# Altium integrated library Integrated_Library - 02.02.25 - 22.49.IntLib: 792 symbols (part 2 of 11) (continued)
## CMP-002-00006-2
designator SD?, comment ST9S008V4AR1500
Micro SD Memory Card Connector, 8 Position, 0.5 A, 10 V, -25 to 85 degC, 8-Pin SMD, RoHS, Tape and Reel; Manufacturer: JAE Electronics; Current Rating: 500mA; Gender: Male; Voltage Rating: 10V; Connector Type: SDCard; Mating Cycles: 10000; Package Version: Rev. 2, 12/2007; Package URL: https://datasheet.ciiva.com/683/sj108062-683405.pdf; Package Reference: ST9S008V4AR1500; Min Operating Temperature: -25°C; Manufacturer URL: http://www.jaeusa.com/; Lead Pitch: 1.1mm; Datasheet URL: http://jae-connector.com/en/pdf/MB-0177-1E_ST9.pdf; RoHS Compliant: True; Pins: 8; Package Quantity: 1500; Mounting Technology: SM; Contact Finish: Gold; Packaging: TapeandReel; Case/Package: ST9S008V4AR1500; Contact Plating: Gold; Package Description: 8-Pin Surface Mount Device, Body 15.2 x 13.7 mm, Pitch 1.1 mm; Max Operating Temperature: 85°C; Datasheet Version: Dec-08; Contact Material: Copper
footprint JAE-ST9S008V4AR1500_V (SD Card, 8-Leads, Body 15.2x13.7mm, Pitch 1.1mm)
pins: 1, 2, 3, 4, 5, 6, 7, 8, MP1, MP2, MP3, MP4, MP5, MP6

## CMP-002-00007-2
designator J?, comment 35RASMT4BHNTRX
Female 3.5 mm Phone Jack, 5 Position, Height 5 mm, RoHS, Tape and Reel; Manufacturer: Switchcraft; Shielding: Unshielded; Connector Type: Audio; Max Current Rating: 3A; Voltage Rating: 250V; Datasheet Version: Rev. C, 07/2014; Case/Package: 35RASMT4BHNTRX; Gender: Female; Package Description: Female 3.5 mm Phone Jack, 5 Position, Height 5 mm; Max Operating Temperature: 85°C; Colour: Black; Manufacturer URL: http://www.switchcraft.com/; Package Reference: 35RASMT4BHNTRX; Packaging: TapeandReel; Pins: 3; Mounting Technology: SM; Min Operating Temperature: -25°C; Contact Material: Copper; Datasheet URL: http://www.switchcraft.com/Drawings/35rasmt4bhntrx_cd.pdf; Contact Plating: Silver; Current Rating: 3A; RoHS Compliant: True; Package Quantity: 800
footprint SWIT-35RASMT4BHNTRX_V (Jack, 5-Leads, Body 17x6mm)
pins: 1, 2, 3, 4, 5

## CMP-002-00008-2
designator J?, comment PJRAN1X1U01X
Female Phono Jack, 3 Position, Height 13 mm, Tail Length 4 mm, RoHS, Bulk; Manufacturer: Switchcraft; Voltage Rating: 34V; Shielding: Unshielded; Current Rating: 2A; Connector Type: Audio; Min Operating Temperature: -25°C; Contact Plating: Silver; Manufacturer URL: http://www.switchcraft.com/; Pins: 1; RoHS Compliant: True; Package Reference: PJRAN1X1U01X; Datasheet Version: Rev. A, 01/2006; Package Description: Female Phono Jack, 3 Position, Height 13 mm, Tail Length 4 mm; Gender: Female; Max Operating Temperature: 85°C; Case/Package: Metal; Datasheet URL: http://www.conxall.com/Drawings/pjran1x1u__x_series_cd.pdf; Contact Material: Copper; Colour: Black; Max Current Rating: 2A; Mounting Technology: TH; Max Voltage Rating (DC): 34V; Package Quantity: 1
footprint SWIT-PJRAN1X1U01X_V (Jack, 3-Leads, Body 19.5x10mm)
pins: 1 SLEEVE, 2 TIP, 3 SHUNT

## CMP-002-00009-2
designator J?, comment RCJ-041
Female RCJ Jack, 2 Position, Height 11.724 mm, Tail Length 4 mm, RoHS, Bulk; Manufacturer: CUI Inc; Connector Type: Audio; Shielding: Unshielded; Housing Material: Plastic; Case/Package: RCJ-041; Min Operating Temperature: -20°C; Contact Material: Brass; Package Reference: RCJ-041; Packaging: Bulk; Package Quantity: 400; Datasheet Version: Rev. B, 02/2012; Manufacturer URL: http://www.cui.com/; Package Description: Female RCJ Jack, 2 Position, Height 11.724 mm, Tail Length 4 mm; RoHS Compliant: True; Datasheet URL: http://www.cui.com/product/resource/rcj-04x.pdf; Max Operating Temperature: 85°C; Gender: Female; Mounting Technology: TH
footprint CUI-RCJ-041_V (Jack, 2-Leads, Body 19.5x10mm)
pins: 1, 2

## CMP-002-00010-2
designator J?, comment SJ-3506-SMT-TR
Female Mid Mount Audio Jack, 6 Position, Height 2.55 mm, Tail Length 2 mm, -25 to 85 degC, RoHS, Tape and Reel; Manufacturer: CUI Inc; Current Rating: 1A; Shielding: Shielded; Max Operating Temperature: 85°C; Connector Type: Audio; Housing Material: Plastic; Datasheet Version: Rev. 1.01, 11/2012; Package Description: Female Mid Mount Audio Jack, 6 Position, Height 2.55 mm, Tail Length 2 mm; Datasheet URL: http://www.cui.com/product/resource/sj-3506-smt.pdf; Gender: Female; Mounting Technology: TH; Min Operating Temperature: -25°C; Contact Material: Brass; Package Reference: SJ-3506-SMT-TR; Case/Package: SJ-3506-SMT-TR; Manufacturer URL: http://www.cui.com/; Package Quantity: 500; Packaging: TapeandReel; RoHS Compliant: True
footprint CUI-SJ-3506-SMT-TR_V (Jack, 6-Leads, Body 15.4x12.8mm)
pins: 1 S "Sleeve", 2 T "Tip", 3 R "Ring", 4 IR "Isolated ring", 5 RN "Isolated ring switch (N-O)", 6 TN "Tip switch", 7 SHLD1 "Shield", 8 SHLD2 "Shield"

## CMP-002-00011-2
designator J?, comment 10029449-001RLF
Type A HDMI Receptacle without Flange, Pitch 0.5 mm, 19 Positions, -55 to 85 degC, RoHS, Tape and Reel; Manufacturer: FCI Electronics; Voltage Rating: 40V; Current Rating: 500mA; Gender: Female; Connector Type: Display; RoHS Compliant: True; Lead Pitch: 0.5mm; Case/Package: Metal; Datasheet Version: Rev. S, 06/2012; Datasheet URL: https://datasheet.ciiva.com/851/10029449-851120.pdf; Contact Material: Copper; Pins: 19; Packaging: TapeandReel; Package Reference: 10029449-001RLF; Colour: Black; Contact Plating: Gold; Package Description: 19-Pin Surface Mount Device, Body 15 x 9 mm, Pitch 0.5 mm; Mounting Technology: SM; Package Quantity: 400; Min Operating Temperature: -55°C; Manufacturer URL: http://portal.fciconnect.com/; Max Operating Temperature: 85°C
footprint FCI-10029449-001RLF_V (SMD, 19-Leads, Body 15x9mm, Pitch 0.5mm)
pins: 1 TMDS DATA2+, 2 TMDS DATA2 SHIELD, 3 TMDS DATA2-, 4 TMDS DATA1+, 5 TMDS DATA1 SHIELD, 6 TMDS DATA1-, 7 TMDS DATA0+, 8 TMDS DATA0 SHIELD, 9 TMDS DATA0-, 10 TMDS CLOCK+, 11 TMDS CLOCK SHIELD, 12 TMDS CLOCK-, 13 CEC, 14 N.C., 15 SCL, 16 SDA, 17 DDC/CEC GROUND, 18 +5V POWER, 19 HOT PLUG DETECT, 20 SHLD1, 21 SHLD2, 22 SHLD3, 23 SHLD4
text: HDMI

## CMP-002-00012-2
designator J?, comment 1747981-1
HDMI Receptacle, Pitch 0.5 mm, 19 Position, Height 6.38 mm, RoHS, Tape and Reel; Manufacturer: TE Connectivity; Gender: Female; Connector Type: Display; Voltage Rating: 40V; Package Reference: 1747981-1; Packaging: TapeandReel; Colour: Silver; Datasheet Version: Rev. F5, 12/2015; Case/Package: Metal; Contact Plating: Gold; Package Description: HDMI Receptacle, Pitch 0.5 mm, 19 Position, Height 6.38 mm; RoHS Compliant: True; Manufacturer URL: http://www.te.com/; Contact Material: Copper; Package Quantity: 300; Pins: 19; Lead Pitch: 0.5mm; Datasheet URL: http://www.te.com/commerce/DocumentDelivery/DDEController?Action=showdoc&DocId=Customer+Drawing%7F1747981%7FF5%7Fpdf%7FEnglish%7FENG_CD_1747981_F5.pdf%7F1747981-1; Mounting Technology: SM
footprint TE-1747981-1_V (Connector, 19-Leads, Body 11.55x15mm, Pitch 0.5mm)
pins: 1 TMDS DATA2+, 2 TMDS DATA2 SHIELD, 3 TMDS DATA2-, 4 TMDS DATA1+, 5 TMDS DATA1 SHIELD, 6 TMDS DATA1-, 7 TMDS DATA0+, 8 TMDS DATA0 SHIELD, 9 TMDS DATA0-, 10 TMDS CLOCK+, 11 TMDS CLOCK SHIELD, 12 TMDS CLOCK-, 13 CEC, 14 N.C., 15 SCL, 16 SDA, 17 DDC/CEC GROUND, 18 +5V POWER, 19 HOT PLUG DETECT, 20 SHLD1, 21 SHLD2, 22 SHLD3, 23 SHLD4
text: HDMI

## CMP-002-00013-2
designator J?, comment RASM722X
Power Jack, 5 A, 250 V, 3-Pin SMD, RoHS, Bulk; Manufacturer: Switchcraft; Connector Type: DCJack; Package Reference: RASM722X; Mounting Technology: SM; Manufacturer URL: http://www.switchcraft.com/; Datasheet URL: http://www.switchcraft.com/Drawings/rasm732x_cd.pdf; RoHS Compliant: Unknown; Datasheet Version: Rev. A, 09/2005; Package Description: 3-Pin Surface Mount Device, Body 14.5 x 9 mm; Case/Package: RASM722X
footprint SWIT-RASM722X_V (SMD, 3-Leads, Body 14.5x9mm)
pins: 1 SLEEVE, 2 TIP, 3 SHUNT

## CMP-002-00014-2
designator P?, comment 1803277
Male Header, Pitch 3.81 mm, 1 x 2 Position, Height 7.25 mm, Tail Length 3.4 mm, RoHS, Bulk; Manufacturer: Phoenix Contact; Voltage Rating: 160V; Current Rating: 8A; Rows: 1; Mounting Technology: TH; Contact Plating: Tin; Case/Package: 1803277; Gender: Male; Diameter: 7.25mm; Datasheet Version: Feb-14; Colour: Green; Pins: 2; Lead Pitch: 0.15inch; Connector Type: Header; Package Quantity: 50; Max Current Rating: 8A; Manufacturer URL: http://www.phoenixcontact.com/; Packaging: Bulk; RoHS Compliant: True; Datasheet URL: https://datasheet.ciiva.com/16096/1803277-16096845.pdf; Package Reference: 1803277; Package Description: Male Header, Pitch 3.81 mm, 1 x 2 Position, Height 7.25 mm, Tail Length 3.4 mm
footprint PHOE-1803277_V (CONN, Body 9.2x9.01mm, Pitch 3.81mm)
pins: 1, 2

## CMP-002-00015-2
designator P?, comment 2340-6111TG
Male Header, Pitch 2.54 mm, 1 x 40 Position, Height 8.636 mm, Tail Length 3.05 mm, -55 to 105 degC, RoHS, Bulk; Manufacturer: 3M; Max Current Rating: 3A; Rows: 1; Max Operating Temperature: 105°C; RoHS Compliant: True; Manufacturer URL: http://www.3m.com/; Package Reference: 2340-6111TG; Package Quantity: 200; Min Operating Temperature: -55°C; Package Description: Male Header, Pitch 2.54 mm, 1 x 40 Position, Height 8.636 mm, Tail Length 3.05 mm; Gender: Male; Datasheet URL: https://datasheet.ciiva.com/5161/ts0766-242217-5161112.pdf; Packaging: Bulk; Lead Pitch: 0.1inch; Mounting Technology: TH; Case/Package: 2340-6111TG; Connector Type: Header; Datasheet Version: Aug-08; Pins: 40; Current Rating: 3A; Contact Finish: Gold; Contact Plating: Gold; Colour: Black; Contact Material: Copper
footprint 3M-2340-6111TG_V (THD, 40-Leads, Body 101.6x2.54mm, Pitch 2.54mm)
pins: 1, 2, 3, 4, 5, 6, 7, 8, 9, 10, 11, 12, 13, 14, 15, 16, 17, 18, 19, 20, 21, 22, 23, 24, 25, 26, 27, 28, 29, 30, 31, 32, 33, 34, 35, 36, 37, 38, 39, 40

## CMP-002-00016-2
designator P?, comment 4-103741-0
Male Header, Pitch 2.54 mm, 1 x 40 Position, Height 8.128 mm, Tail Length 2.286 mm, RoHS, Bulk; Manufacturer: TE Connectivity; Max Contact Resistance: 20mohm; Rows: 1; Current Rating: 3A; Max Current Rating: 1A; Contact Finish: Lead; Colour: Black; Package Reference: 4-103741-0; Contact Gender: Male; Packaging: Bulk; Contact Material: Bronze; Datasheet URL: http://sigma.octopart.com/12533693/technical_drawing/Agastat-4-103741-0.pdf; Package Description: Male Header, Pitch 2.54 mm, 1 x 40 Position, Height 8.128 mm, Tail Length 2.286 mm; Mounting Technology: TH; RoHS Compliant: True; Pins: 40; Gender: Male; Package Quantity: 100; Max Operating Temperature: 105°C; Min Operating Temperature: -65°C; Manufacturer URL: http://www.te.com/; Case/Package: 4-103741-0; Lead Pitch: 0.1inch; Contact Plating: Tin; Datasheet Version: Mar-11; Connector Type: Header
footprint TECO-4-103741-0_V (THD, 40-Leads, Body 101.194x2.337mm, Pitch 2.54mm)
pins: 1, 2, 3, 4, 5, 6, 7, 8, 9, 10, 11, 12, 13, 14, 15, 16, 17, 18, 19, 20, 21, 22, 23, 24, 25, 26, 27, 28, 29, 30, 31, 32, 33, 34, 35, 36, 37, 38, 39, 40

## CMP-002-00017-2
designator P?, comment 4-103777-0
Male Header, Pitch 2.54 mm, 2 x 40 Position, Height 8.13 mm, Tail Length 2.29 mm, -65 to 105 degC, RoHS, Bulk; Manufacturer: TE Connectivity; Rows: 2; Current Rating: 3A; Contact Material: Bronze; Contact Plating: Tin; Case/Package: 4-103777-0; Colour: Black; Packaging: Bulk; Datasheet URL: http://www.onlinecomponents.com/datasheet/41037770.aspx?p=10364676; Package Description: Male Header, Pitch 2.54 mm, 2 x 40 Position, Height 8.13 mm, Tail Length 2.29 mm; Datasheet Version: Rev. 6-04, 03/2006; Max Operating Temperature: 105°C; Contact Finish: Lead; RoHS Compliant: True; Package URL: http://www.mouser.com/ds/2/418/NG_CD_103777_F2-615203.pdf; Connector Type: Header; Lead Pitch: 2.54mm; Min Operating Temperature: -65°C; Gender: Male; Mounting Technology: TH; Pins: 80; Manufacturer URL: http://www.te.com/; Contact Gender: Male; Package Quantity: 50; Package Reference: 4-103777-0
footprint TECO-4-103777-0_V (THD, 80-Leads, Body 101.19x4.88mm, Pitch 2.54mm)
pins: 1, 2, 3, 4, 5, 6, 7, 8, 9, 10, 11, 12, 13, 14, 15, 16, 17, 18, 19, 20, 21, 22, 23, 24, 25, 26, 27, 28, 29, 30, 31, 32, 33, 34, 35, 36, 37, 38, 39, 40, 41, 42, 43, 44, 45, 46, 47, 48, 49, 50, 51, 52, 53, 54, 55, 56, 57, 58, 59, 60, 61, 62, 63, 64, 65, 66, 67, 68, 69, 70, 71, 72, 73, 74, 75, 76, 77, 78, 79, 80

## CMP-002-00018-2
designator P?, comment 5-146130-2
Male Header, Pitch 2.54 mm, 2 x 3 Position, Height 8.13 mm, -65 to 125 degC, RoHS, Tube; Manufacturer: TE Connectivity; Max Operating Temperature: 125°C; Datasheet Version: Oct-15; Package Description: Male Header, Pitch 2.54 mm, 2 x 3 Position, Height 8.13 mm; Case/Package: 5-146130-2; Datasheet URL: http://www.te.com/commerce/DocumentDelivery/DDEController?Action=showdoc&DocId=Customer+Drawing%7F146130%7FM%7Fpdf%7FEnglish%7FENG_CD_146130_M.pdf%7F5-146130-2; Manufacturer URL: http://www.te.com/; Connector Type: Header; Gender: Male; Mounting Technology: SM; Min Operating Temperature: -65°C; RoHS Compliant: Unknown; Package Reference: 5-146130-2
footprint TECO-5-146130-2_V (Header, 6-Leads, Body 7.21x4.88mm, Pitch 2.54mm)
pins: 1, 2, 3, 4, 5, 6

## CMP-002-00019-2
designator J?, comment 5-534237-8
Female Receptacle, Pitch 2.54 mm, 1 x 10 Position, Height 8.64 mm, Tail Length 2.92 mm, -65 to 105 degC, RoHS, Tube; Manufacturer: TE Connectivity; Max Contact Resistance: 12mohm; Connector Type: Header; Current Rating: 2A; Voltage Rating: 750V; Rows: 1; Datasheet Version: Apr-13; Contact Plating: Gold; Min Operating Temperature: -65°C; Manufacturer URL: http://www.te.com/; Mounting Technology: TH; Contact Material: Bronze; RoHS Compliant: True; Packaging: Rail/Tube; Contact Finish: Gold; Pins: 10; Case/Package: 5-534237-8; Max Operating Temperature: 105°C; Lead Pitch: 2.54mm; Gender: Female; Package Quantity: 22; Colour: Black; Package Description: Female Receptacle, Pitch 2.54 mm, 1 x 10 Position, Height 8.64 mm, Tail Length 2.92 mm; Package Reference: 5-534237-8; Datasheet URL: http://www.te.com/commerce/DocumentDelivery/DDEController?Action=showdoc&DocId=Customer+Drawing%7F534237%7FR5%7Fpdf%7FEnglish%7FENG_CD_534237_R5.pdf%7F5-534237-8
footprint TECO-5-534237-8_V (Receptacle, 10-Leads, Body 25.4x3.56mm, Pitch 2.54mm)
pins: 1, 2, 3, 4, 5, 6, 7, 8, 9, 10

## CMP-002-00020-2
designator P?, comment 68021-210HLF
Male Header, Pitch 2.54 mm, 2 x 5 Position, Height 4.83 mm, Tail Length 3.05 mm, Bulk; Manufacturer: FCI Electronics; Datasheet URL: http://portal.fciconnect.com/Comergent//fci/drawing/68020.pdf; Case/Package: 68021-210HLF-10; Manufacturer URL: http://portal.fciconnect.com/; Connector Type: Header; Mounting Technology: TH; Datasheet Version: Rev. BM, 04/2015; Package Description: Male Header, Pitch 2.54 mm, 2 x 5 Position, Height 4.83 mm, Tail Length 3.05 mm; Gender: Male; RoHS Compliant: Unknown; Package Reference: 68021-210HLF-10
footprint FCI-68021-210HLF-10_V (THD, 10-Leads, Body 12.7x2.54mm, Pitch 2.54mm)
pins: 1, 2, 3, 4, 5, 6, 7, 8, 9, 10

## CMP-002-00021-2
designator P?, comment 77311-462K05LF
Male Header, Pitch 2.54 mm, 1 x 5 Position, Height 16.24 mm, Tail Length 3.05 mm, -65 to 125 degC, RoHS, Tape and Reel; Manufacturer: FCI Electronics; Connector Type: Header; Manufacturer URL: http://portal.fciconnect.com/; Datasheet URL: http://portal.fciconnect.com/Comergent//fci/drawing/77311.pdf; Gender: Male; Case/Package: 77311-5; Package Reference: 77311-5; Datasheet Version: Rev. CK, 07/2016; Package Description: Male Header, Pitch 2.54 mm, 1 x 5 Position, Height 16.24 mm, Tail Length 3.05 mm; RoHS Compliant: Unknown; Mounting Technology: TH
footprint FCI-77311-5_V (THD, 5-Leads, Body 12.7x2.4mm, Pitch 2.54mm)
pins: 1 DTR, 2 RXI, 3 TXO, 4 VCC, 5 CTS

## CMP-002-00022-2
designator P?, comment 9-146281-0
Male Header, Pitch 2.54 mm, 1 x 40 Position, Height 8.21 mm, Tail Length 3.05 mm, -65 to 105 degC, RoHS, Bulk; Manufacturer: TE Connectivity; Current Rating: 3A; Rows: 1; Datasheet URL: http://www.te.com/commerce/DocumentDelivery/DDEController?Action=showdoc&DocId=Customer+Drawing%7F146281%7FG%7Fpdf%7FEnglish%7FENG_CD_146281_G_146281_1_c.dwg.pdf%7F9-146281-0; Contact Plating: Gold; Packaging: Tray; Lead Pitch: 2.54mm; Max Operating Temperature: 105°C; Manufacturer URL: http://www.te.com/; Connector Type: Header; Package Reference: 9-146281-0; Gender: Male; Package Description: Male Header, Pitch 2.54 mm, 1 x 40 Position, Height 8.21 mm, Tail Length 3.05 mm; Package Quantity: 100; Datasheet Version: Rev. G, 07/2014; Contact Gender: Male; Colour: Black; RoHS Compliant: True; Min Operating Temperature: -65°C; Mounting Technology: TH; Contact Material: Bronze; Package URL: http://www.te.com/commerce/DocumentDelivery/DDEController?Action=showdoc&DocId=Catalog+Section%7F1307819_SECTION_5%7F0908%7Fpdf%7FEnglish%7FENG_CS_1307819_SECTION_5_0908.pdf%7F9-146281-0; Case/Package: 9-146281-0; Contact Finish: Gold; Pins: 40
footprint TECO-9-146281-0_V (Header, 40-Leads, Body 101.2x2.34mm, Pitch 2.54mm)
pins: 1, 2, 3, 4, 5, 6, 7, 8, 9, 10, 11, 12, 13, 14, 15, 16, 17, 18, 19, 20, 21, 22, 23, 24, 25, 26, 27, 28, 29, 30, 31, 32, 33, 34, 35, 36, 37, 38, 39, 40

## CMP-002-00023-2
designator J?, comment 929850-01-10-RA
Female Header, Pitch 2.54 mm, 1 x 10 Position, Height 8.26 mm, Tail Length 3.18 mm, -40 to 105 degC, RoHS, Bulk; Manufacturer: 3M; Current Rating: 1A; Datasheet Version: Jun-13; Contact Finish: Gold; Package Description: Female Header, Pitch 2.54 mm, 1 x 10 Position, Height 8.26 mm, Tail Length 3.18 mm; Mounting Technology: TH; Max Operating Temperature: 105°C; Pins: 10; Lead Pitch: 2.54mm; RoHS Compliant: True; Contact Plating: Gold; Min Operating Temperature: -40°C; Colour: Black; Contact Gender: Female; Package Reference: 929850-01-10-RA; Gender: Female; Case/Package: 929850-01-10-RA; Packaging: Bulk; Package Quantity: 300; Datasheet URL: http://multimedia.3m.com/mws/media/22500O/3mtm-boardmount-skt-100-100x-100strt-sldr-tails-ts0815.pdf; Connector Type: Header; Contact Material: Copper; Manufacturer URL: http://www.3m.com/
footprint 3M-929850-01-10-RA_V (THD, 10-Leads, Body 25.4x2.54mm, Pitch 2.54mm)
pins: 1, 2, 3, 4, 5, 6, 7, 8, 9, 10

## CMP-002-00024-2
designator P?, comment 95278-101A06LF
Male Header, Pitch 2.54 mm, 2 x 3 Position, Height 14.4 mm, RoHS, Tape and Reel; Manufacturer: Amphenol; Package Reference: 95278-101A06LF; Package Description: Male Header, Pitch 2.54 mm, 2 x 3 Position, Height 14.4 mm; RoHS Compliant: Unknown; Case/Package: 95278-101A06LF; Connector Type: Header; Mounting Technology: SM; Gender: Male; Datasheet URL: http://portal.fciconnect.com/Comergent//fci/drawing/95278.pdf; Datasheet Version: Rev. AC, 03/2016
footprint AMPM-95278-101A06LF_V (SMD, 6-Leads, Body 7.26x4.83mm, Pitch 2.54mm)
pins: 1, 2, 3, 4, 5, 6

## CMP-002-00025-2
designator P?, comment B2P-VH(LF)(SN)
Male Header, Pitch 3.96 mm, 1 x 2 Position, Height 10.9 mm, Tail Length 3.7 mm, -25 to 85 degC, RoHS, Bulk; Manufacturer: JST; Case/Package: B2P-VH(LF)(SN); Connector Type: Header; Mounting Technology: TH; Package Reference: B2P-VH(LF)(SN); Package Description: Male Header, Pitch 3.96 mm, 1 x 2 Position, Height 10.9 mm, Tail Length 3.7 mm; Max Operating Temperature: 85°C; Manufacturer URL: http://www.jst.com/home2.html; RoHS Compliant: Unknown; Datasheet Version: May-16; Gender: Male; Min Operating Temperature: -25°C; Datasheet URL: http://www.jst-mfg.com/product/pdf/eng/eVH.pdf
footprint JST-B2P-VH(LF)(SN)_V (THD, 2-Leads, Body 8.5x7.86mm, Pitch 3.96mm)
pins: 1, 2

## CMP-002-00026-2
designator P?, comment B3P-VH(LF)(SN)
Male Header, Pitch 3.96 mm, 1 x 3 Position, Height 10.9 mm, Tail Length 3.7 mm, -25 to 85 degC, RoHS, Bulk; Manufacturer: JST; Case/Package: B3P-VH(LF)(SN); Connector Type: Header; Datasheet Version: May-16; Mounting Technology: TH; Package Description: Male Header, Pitch 3.96 mm, 1 x 3 Position, Height 10.9 mm, Tail Length 3.7 mm; Gender: Male; Manufacturer URL: http://www.jst.com/home2.html; Package Reference: B3P-VH(LF)(SN); Datasheet URL: http://www.jst-mfg.com/product/pdf/eng/eVH.pdf; Min Operating Temperature: -25°C; Max Operating Temperature: 85°C; RoHS Compliant: Unknown
footprint JST-B3P-VH(LF)(SN)-3_V (Connector, 3-Leads, Body 8.5x11.82mm, Pitch 3.96mm)
pins: 1, 2, 3

## CMP-002-00027-2
designator P?, comment PEC36SFCN
Male Header, Pitch 2.54 mm, 1 x 36 Position, Height 10.62 mm, Tail Length 8.13 mm, -65 to 125 degC, RoHS, Bulk; Manufacturer: Sullins; Contact Finish: Tin; Datasheet Version: Apr-13; Pins: 36; Datasheet URL: http://disti-assets.s3.amazonaws.com/testco-inc/files/datasheets/17515.pdf; RoHS Compliant: True; Case/Package: PEC36SFCN; Package Reference: PEC36SFCN; Colour: Black; Gender: Male; Connector Type: Header; Package Quantity: 1; Packaging: Bulk; Mounting Technology: TH; Package Description: Male Header, Pitch 2.54 mm, 1 x 36 Position, Height 10.62 mm, Tail Length 8.13 mm; Package URL: http://www.sullinscorp.com/drawings/77____C___S___N-OMIT,_M500,_STRAIGHT,_C10436.pdf; Lead Pitch: 0.1inch
footprint SLIN-PEC36SFCN_V (THD, 36-Leads, Body 91.44x2.54mm, Pitch 2.54mm)
pins: 1, 2, 3, 4, 5, 6, 7, 8, 9, 10, 11, 12, 13, 14, 15, 16, 17, 18, 19, 20, 21, 22, 23, 24, 25, 26, 27, 28, 29, 30, 31, 32, 33, 34, 35, 36

## CMP-002-00028-2
designator J?, comment PPPC081LFBN-RC
Female Header, Pitch 2.54 mm, 1 x 8 Position, Height 8.5 mm, Tail Length 3.2 mm, -40 to 105 degC, RoHS, Bulk; Manufacturer: Sullins; Package Reference: PPPC081LFBN-RC; Connector Type: Header; Datasheet Version: Jan-15; Package Description: Female Header, Pitch 2.54 mm, 1 x 8 Position, Height 8.5 mm, Tail Length 3.2 mm; RoHS Compliant: Unknown; Max Operating Temperature: 105°C; Case/Package: PPPC081LFBN-RC; Min Operating Temperature: -40°C; Datasheet URL: http://sullinscorp.com/catalogs/101_PAGE114-115_.100_FEMALE_HDR.pdf; Gender: Female; Mounting Technology: TH
footprint SLIN-PPPC081LFBN-RC_V (THD, 8-Leads, Body 20.82x2.54mm, Pitch 2.54mm)
pins: 1, 2, 3, 4, 5, 6, 7, 8

## CMP-002-00029-2
designator J?, comment PPPC102LFBN-RC
Female Header, Pitch 2.54 mm, 2 x 10 Position, Height 8.75 mm, Tail Length 3.2 mm, -40 to 105 degC, RoHS, Bulk; Manufacturer: Sullins; Mounting Technology: TH; RoHS Compliant: Unknown; Gender: Female; Case/Package: PPPC102LFBN-RC; Min Operating Temperature: -40°C; Datasheet Version: Rev. D, 10/2007; Max Operating Temperature: 105°C; Package Description: Female Header, Pitch 2.54 mm, 2 x 10 Position, Height 8.75 mm, Tail Length 3.2 mm; Package Reference: PPPC102LFBN-RC; Connector Type: Header; Datasheet URL: http://datasheet.octopart.com/PPPC102LFBN-RC-Sullins-datasheet-8327184.pdf
footprint SLIN-PPPC102LFBN-RC_V (THD, 20-Leads, Body 25.9x5mm, Pitch 2.54mm)
pins: 1, 2, 3, 4, 5, 6, 7, 8, 9, 10, 11, 12, 13, 14, 15, 16, 17, 18, 19, 20

## CMP-002-00030-3
designator P?, comment S2B-PH-K-S-GW
S2B Series 2 Circuit 2 mm Pitch Side Entry Through Hole Shrouded Header; Manufacturer: Japan Solderless Terminals; Gender: Male; Datasheet Version: Dec-12; Package Description: Male Header, Pitch 2 mm, 1 x 2 Position, Height 4.8 mm, Tail Length 3.4 mm; Case/Package: S2B-PH-K-S; Min Operating Temperature: -25°C; Package Reference: S2B-PH-K-S; Connector Type: Header; Max Operating Temperature: 85°C; Datasheet URL: http://www.jst-mfg.com/product/pdf/eng/ePH.pdf; Mounting Technology: SM; RoHS Compliant: Unknown
footprint JST-S2B-PH-K-S_V (THD, 2-Leads, Body 7.6x5.9mm, Pitch 2mm)
pins: 1, 2

## CMP-002-00031-2
designator P?, comment S2B-PH-SM4-TB(LF)(SN)
Male Header, Pitch 2 mm, 1 x 2 Position, Height 5.5 mm, -25 to 85 degC, RoHS, Tape and Reel; Manufacturer: JST; Package Reference: S2B-PH-SM4-TB(LF)(SN)-2; Mounting Technology: SM; Manufacturer URL: http://www.jst.com/home2.html; Package Description: Male Header, Pitch 2 mm, 1 x 2 Position, Height 5.5 mm; Max Operating Temperature: 85°C; Case/Package: S2B-PH-SM4-TB(LF)(SN)-2; Datasheet URL: http://www.jst-mfg.com/product/pdf/eng/ePH.pdf; Connector Type: Header; RoHS Compliant: Unknown; Datasheet Version: Dec-12; Gender: Male; Min Operating Temperature: -25°C
footprint JST- S2B-PH-SM4-TB(LF)(SN)-2_V (SMD, 2-Leads, Body 7.9x7.6mm, Pitch 2mm)
pins: 1, 2, MP1, MP2

## CMP-002-00032-2
designator P?, comment S2B-XH-A(LF)(SN)
Male Header, Pitch 2.5 mm, 1 x 2 Position, Height 6.1 mm, Tail Length 3.4 mm, -25 to 85 degC, RoHS, Bulk; Manufacturer: JST; Case/Package: S2B-XH-A(LF)(SN); Package Description: XH Series Disconnectable Crimp Style Connector, Pitch 2.5 mm, 1 x 2 Position, Height 6.1 mm, Tail Length 3.4 mm; Manufacturer URL: http://www.jst.com/home2.html; Datasheet URL: http://www.jst-mfg.com/product/pdf/eng/eXH.pdf; Connector Type: Header; Package Reference: S2B-XH-A(LF)(SN); Mounting Technology: TH; Max Operating Temperature: 85°C; Min Operating Temperature: -25°C; Datasheet Version: May-16; Gender: Male; RoHS Compliant: Unknown
footprint JST-S2B-XH-A(LF)(SN)_V (Header, 2-Leads, Body 7.4x11.5mm, Pitch 2.5mm)
pins: 1, 2

## CMP-002-00033-2
designator P?, comment S3B-XH-A(LF)(SN)
Male Header, Pitch 2.5 mm, 1 x 3 Position, Height 6.1 mm, Tail Length 3.4 mm, -25 to 85 degC, RoHS, Bulk; Manufacturer: JST; Package Description: Male Header, Pitch 2.5 mm, 1 x 3 Position, Height 6.1 mm, Tail Length 3.4 mm; Manufacturer URL: http://www.jst.com/home2.html; Datasheet URL: http://www.jst-mfg.com/product/pdf/eng/eXH.pdf; RoHS Compliant: Unknown; Connector Type: Header; Package Reference: S3B-XH-A(LF)(SN); Gender: Male; Case/Package: S3B-XH-A(LF)(SN); Mounting Technology: TH; Max Operating Temperature: 85°C; Min Operating Temperature: -25°C; Datasheet Version: May-16
footprint JST-S3B-XH-A(LF)(SN)_V (Header, 3-Leads, Body 9.9x11.5mm, Pitch 2.5mm)
pins: 1, 2, 3

## CMP-002-00034-2
designator P?, comment S4B-XH-A(LF)(SN)
Male Header, Pitch 2.5 mm, 1 x 4 Position, Height 6.1 mm, Tail Length 3.4 mm, -25 to 85 degC, RoHS, Bulk; Manufacturer: JST; Manufacturer URL: http://www.jst.com/home2.html; RoHS Compliant: Unknown; Gender: Male; Min Operating Temperature: -25°C; Datasheet URL: http://www.jst-mfg.com/product/pdf/eng/eXH.pdf; Case/Package: S4B-XH-A(LF)(SN); Datasheet Version: May-16; Mounting Technology: TH; Package Reference: S4B-XH-A(LF)(SN); Max Operating Temperature: 85°C; Package Description: XH Series Disconnectable Crimp Style Connector, Pitch 2.5 mm, 1 x 4 Position, Height 6.1 mm, Tail Length 3.4 mm; Connector Type: Header
footprint JST-S4B-XH-A(LF)(SN)_V (Header, 4-Leads, Body 12.4x11.5mm, Pitch 2.5mm)
pins: 1, 2, 3, 4

## CMP-002-00035-2
designator J?, comment U.FL-R-SMT(10)
Ultra Small Surface Mount Coaxial Connector, 50 Ohm, -40 to 90 degC, 3-Pin SMD, RoHS, Tape and Reel; Manufacturer: Hirose Electric; Impedance: 50Ohm; Connector Type: RF&Coax; RoHS Compliant: True; Datasheet Version: Aug-16; Contact Material: Brass; Packaging: TapeandReel; Mounting Technology: SM; Package Description: 3-Pin Surface Mount Device, Body 2.6 x 2.6 mm; Max Operating Temperature: 90°C; Datasheet URL: https://www.hirose.com/product/en/download_file/key_name/U.FL/category/Catalog/doc_file_id/31697/?file_category_id=4&item_id=15&is_series=1; Package Reference: U.FL-R-SMT; Contact Plating: Gold; Min Operating Temperature: -40°C; Fastening Type: Snap; Package Quantity: 2500; Resistance: 50Ohm; Manufacturer URL: https://www.hirose.com; Case/Package: U.FL-R-SMT
footprint HRS-U.FL-R-SMT_V (SMD, 3-Leads, Body 2.6x2.6mm)
pins: 1 GND (power), 2 GND (power), 3 SIG

## CMP-002-00036-2
designator J?, comment A-1JB
AMC PCB Jack, 0 to 60 GHz, 60 V, -40 to 90 degC, 4-Pin SMD, RoHS, Tape and Reel; Manufacturer: Amphenol; Connector Type: TerminalBlock; Mating Cycles: 30; Impedance: 50Ohm; Frequency: 6Hz; Min Operating Temperature: -40°C; Contact Material: Brass; Max Operating Temperature: 155°C; Datasheet URL: http://drawings.amphenolrf.com/Customer_Outline/CA-1JB.pdf; RoHS Compliant: True; Contact Plating: Gold; Package Reference: A-1JB; Packaging: TapeandReel; Case/Package: A-1JB; Fastening Type: Snap; Mounting Technology: SM; Datasheet Version: Rev. K, 05/2016; Package Quantity: 2500; Package Description: 4-Pin Surface Mount Device, Body 2.6 x 2.6 mm
footprint AMPH-A-1JB_V (SMD, 4-Leads, Body 2.6x2.6mm)
pins: 1, 2, 3, 4

## CMP-002-00037-2
designator TP?, comment 5003
Test Point, Orange, Height 4.6 mm, Tail Length 3 mm, 1-Pin THD, RoHS; Manufacturer: Keystone; Colour: Orange; Packaging: Bulk; Package Description: 1-Pin Through Hole Device, Dia 2.54 mm; Pins: 1; Package Reference: 5003; Datasheet Version: Jun-15; Case/Package: 5003; Mounting Technology: TH; Connector Type: TestPoint; Diameter: 2.54mm; Contact Material: Bronze; Datasheet URL: http://keyelco.com/userAssets/file/M65p56.pdf; Manufacturer URL: http://www.keyelco.com/; Package Quantity: 10; Contact Plating: Tin; RoHS Compliant: True
footprint KSTN-5003 (Test Point, Through Hole, Dia 2.54mm)
pins: 1
